# Altium footprint library Resistor.PcbLib: 88 footprints (part 5 of 6)
Each footprint in its own frame and in the unit in brackets; x right, y up, seen from the top. Pads: shape width x height; smd on the part's side, far side on the other; paste and mask are expansions set on the pad; w line width, h text height; cw(c..) or ccw(c..) is an arc to the next point about the centre after c.
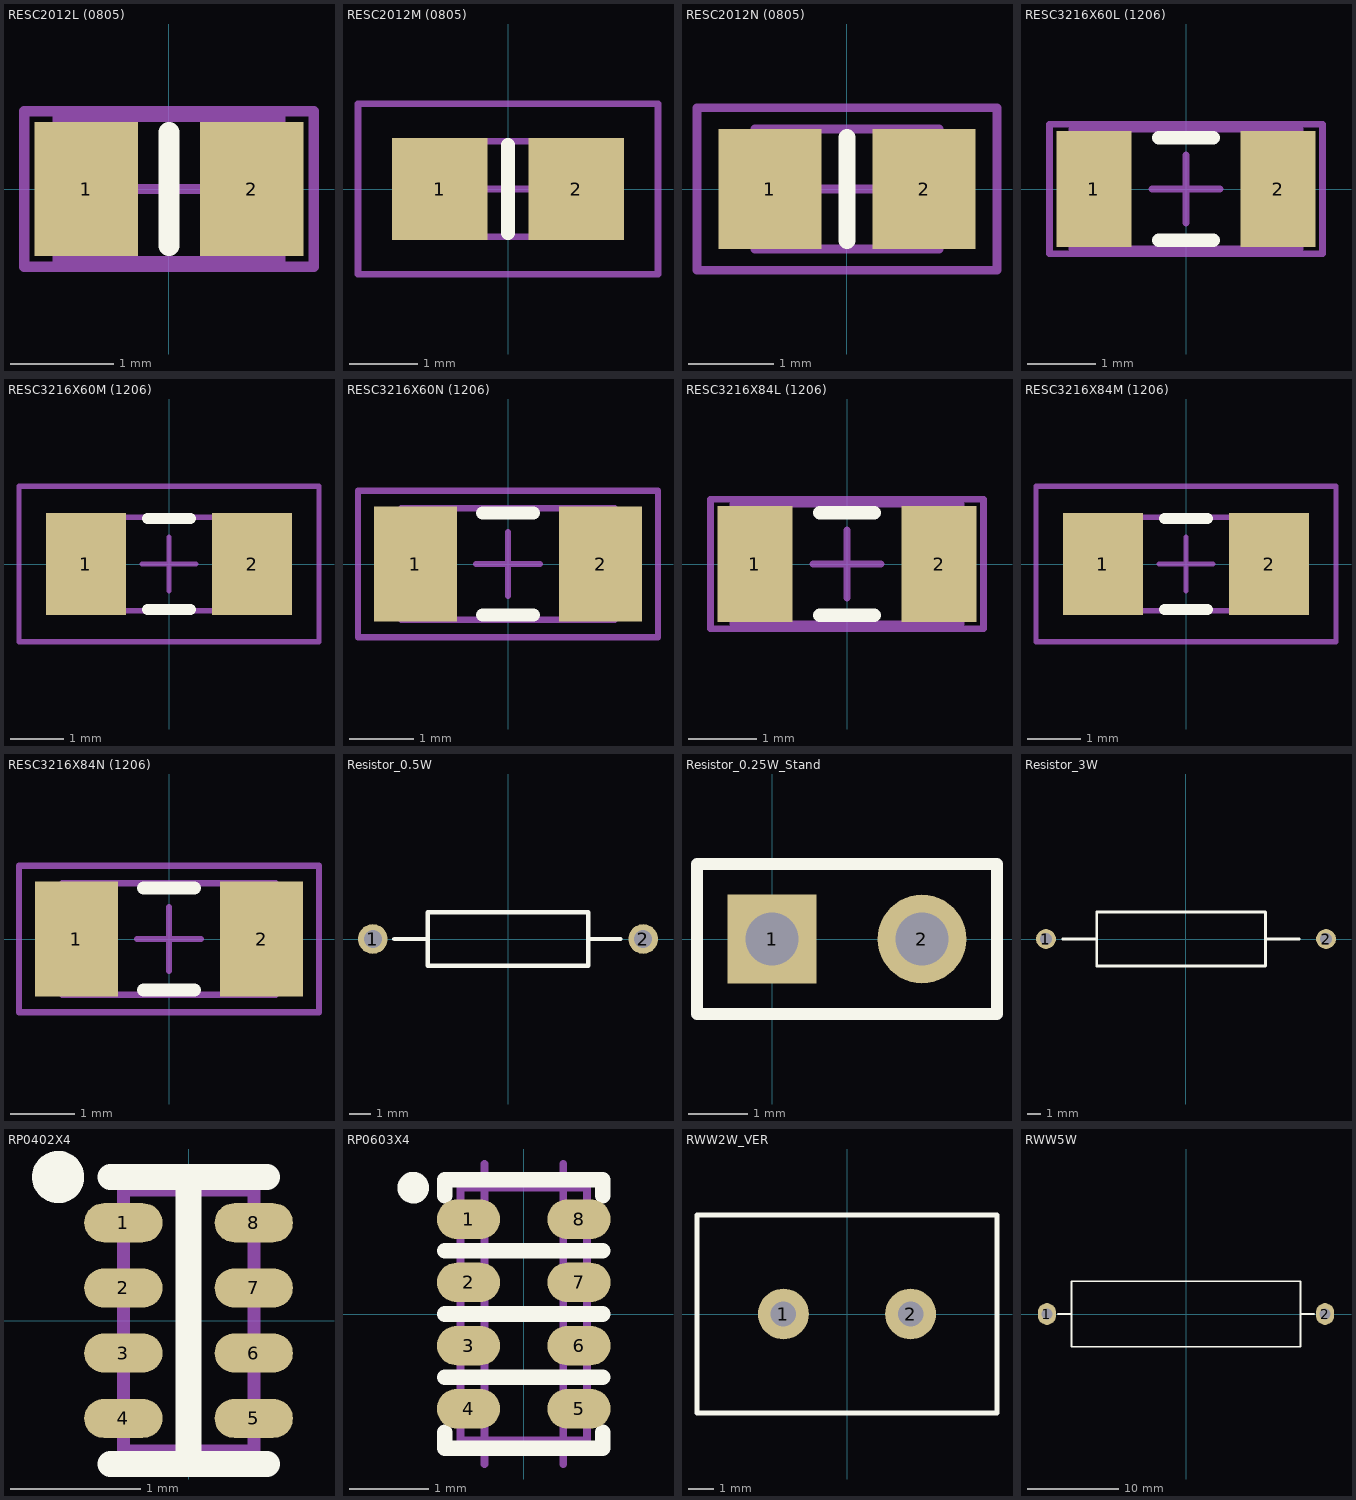
[diagram p4: the footprints below, top view; thin cyan lines are the x and y axes]

## RESC2012L (0805) [mm] "Chip Resistor, Body 2.0x1.3mm, IPC High Density"
height 0.65
pads (2):
  rect 1x1.3 smd: 1(-0.8,0) 2(0.8,0)
Top Overlay:
  lines w0.2: 0,-0.55 0,0.55
Mechanical 13:
  lines w0.1: -1.075,-0.7 -1.075,0.7 1.075,0.7 1.075,-0.7 -1.075,-0.7
Mechanical 15:
  lines w0.1: -0.5,0 0.5,0 ; 0,-0.5 0,0.5 ; -1.4,-0.75 -1.4,0.75 1.4,0.75 1.4,-0.75 -1.4,-0.75
3D body "0805.STEP": height 0.6, standoff 0, extent -1.016,-0.635 1.016,0.635

## RESC2012M (0805) [mm] "Chip Resistor, Body 2.0x1.3mm, IPC Low Density"
height 0.65
pads (2):
  rect 1.4x1.5 smd: 1(-1,0) 2(1,0)
Top Overlay:
  lines w0.2: 0,-0.65 0,0.65
Mechanical 13:
  lines w0.1: -1.075,-0.7 1.075,-0.7 1.075,0.7 -1.075,0.7 -1.075,-0.7
Mechanical 15:
  lines w0.1: -0.5,0 0.5,0 ; 0,-0.5 0,0.5 ; -2.2,-1.25 2.2,-1.25 2.2,1.25 -2.2,1.25 -2.2,-1.25
3D body "0805.STEP": height 0.6, standoff 0, extent -1.016,-0.635 1.016,0.635

## RESC2012N (0805) [mm] "Chip Resistor, Body 2.0x1.3mm, IPC Medium Density"
height 0.65
pads (2):
  rect 1.2x1.4 smd: 1(-0.9,0) 2(0.9,0)
Top Overlay:
  lines w0.2: 0,-0.6 0,0.6
Mechanical 13:
  lines w0.1: -1.075,-0.7 1.075,-0.7 1.075,0.7 -1.075,0.7 -1.075,-0.7
Mechanical 15:
  lines w0.1: -0.5,0 0.5,0 ; 0,-0.5 0,0.5 ; -1.75,-0.95 1.75,-0.95 1.75,0.95 -1.75,0.95 -1.75,-0.95
3D body "0805.STEP": height 0.6, standoff 0, extent -1.016,-0.635 1.016,0.635

## RESC3216X60L (1206) [mm] "Chip Resistor, Body 3.2x1.6x0.60 mm, IPC High Density"
height 0.61
pads (2):
  rect 1.1x1.7 smd: 1(-1.35,0) 2(1.35,0)
Top Overlay:
  lines w0.2: -0.4,-0.75 0.4,-0.75 ; -0.4,0.75 0.4,0.75
Mechanical 13:
  lines w0.1: -1.675,-0.875 1.675,-0.875 1.675,0.875 -1.675,0.875 -1.675,-0.875
Mechanical 15:
  lines w0.1: -0.5,0 0.5,0 ; 0,-0.5 0,0.5 ; -2,-0.95 2,-0.95 2,0.95 -2,0.95 -2,-0.95
3D body: height 0.6, standoff 0.6, extent -1.143,-0.737 1.143,0.737
3D body "RESC3216X60N.STEP": height 0.6, standoff 0, extent -1.6,-0.8 1.6,0.8

## RESC3216X60M (1206) [mm] "Chip Resistor, Body 3.2x1.6x0.60mm, IPC Low Density"
height 0.61
pads (2):
  rect 1.5x1.9 smd: 1(-1.55,0) 2(1.55,0)
Top Overlay:
  lines w0.2: -0.4,-0.85 0.4,-0.85 ; -0.4,0.85 0.4,0.85
Mechanical 13:
  lines w0.1: -1.675,-0.875 1.675,-0.875 1.675,0.875 -1.675,0.875 -1.675,-0.875
Mechanical 15:
  lines w0.1: -0.5,0 0.5,0 ; 0,-0.5 0,0.5 ; -2.8,-1.45 2.8,-1.45 2.8,1.45 -2.8,1.45 -2.8,-1.45
3D body: height 0.6, standoff 0.6, extent -1.143,-0.737 1.143,0.737
3D body "RESC3216X60N.STEP": height 0.6, standoff 0, extent -1.6,-0.8 1.6,0.8

## RESC3216X60N (1206) [mm] "Chip Resistor, Body 3.2x1.6x0.60 mm, IPC Medium Density"
height 0.61
pads (2):
  rect 1.3x1.8 smd: 1(-1.45,0) 2(1.45,0)
Top Overlay:
  lines w0.2: -0.4,-0.8 0.4,-0.8 ; -0.4,0.8 0.4,0.8
Mechanical 13:
  lines w0.1: -1.675,-0.875 -1.675,0.875 1.675,0.875 1.675,-0.875 -1.675,-0.875
Mechanical 15:
  lines w0.1: -0.5,0 0.5,0 ; 0,-0.5 0,0.5 ; -2.35,-1.15 -2.35,1.15 2.35,1.15 2.35,-1.15 -2.35,-1.15
3D body: height 0.6, standoff 0.6, extent -1.143,-0.737 1.143,0.737
3D body "RESC3216X60N.STEP": height 0.6, standoff 0, extent -1.6,-0.8 1.6,0.8

## RESC3216X84L (1206) [mm] "Chip Resistor, Body 3.2x1.6x0.84 mm, IPC High Density"
height 0.85
pads (2):
  rect 1.1x1.7 smd: 1(-1.35,0) 2(1.35,0)
Top Overlay:
  lines w0.2: -0.4,-0.75 0.4,-0.75 ; -0.4,0.75 0.4,0.75
Mechanical 13:
  lines w0.1: -1.675,-0.875 -1.675,0.875 1.675,0.875 1.675,-0.875 -1.675,-0.875
Mechanical 15:
  lines w0.1: -0.5,0 0.5,0 ; 0,-0.5 0,0.5 ; -2,-0.95 -2,0.95 2,0.95 2,-0.95 -2,-0.95
3D body "RESC3216X84N.STEP": height 0.84, standoff 0, extent -1.6,-0.8 1.6,0.8

## RESC3216X84M (1206) [mm] "Chip Resistor, Body 3.2x1.6x0.84mm, IPC Low Density"
height 0.85
pads (2):
  rect 1.5x1.9 smd: 1(-1.55,0) 2(1.55,0)
Top Overlay:
  lines w0.2: -0.4,-0.85 0.4,-0.85 ; -0.4,0.85 0.4,0.85
Mechanical 13:
  lines w0.1: -1.675,-0.875 -1.675,0.875 1.675,0.875 1.675,-0.875 -1.675,-0.875
Mechanical 15:
  lines w0.1: -0.5,0 0.5,0 ; 0,-0.5 0,0.5 ; -2.8,-1.45 -2.8,1.45 2.8,1.45 2.8,-1.45 -2.8,-1.45
3D body: height 0.84, standoff 0.84, extent -1.143,-0.737 1.143,0.737
3D body "RESC3216X84N.STEP": height 0.84, standoff 0, extent -1.6,-0.8 1.6,0.8

## RESC3216X84N (1206) [mm] "Chip Resistor, Body 3.2x1.6x0.84 mm, IPC Medium Density"
height 0.85
pads (2):
  rect 1.3x1.8 smd: 1(-1.45,0) 2(1.45,0)
Top Overlay:
  lines w0.2: -0.4,-0.8 0.4,-0.8 ; -0.4,0.8 0.4,0.8
Mechanical 13:
  lines w0.1: -1.675,-0.875 -1.675,0.875 1.675,0.875 1.675,-0.875 -1.675,-0.875
Mechanical 15:
  lines w0.1: -0.5,0 0.5,0 ; 0,-0.5 0,0.5 ; -2.35,-1.15 -2.35,1.15 2.35,1.15 2.35,-1.15 -2.35,-1.15
3D body: height 0.84, standoff 0.84, extent -1.143,-0.737 1.143,0.737
3D body "RESC3216X84N.STEP": height 0.84, standoff 0, extent -1.6,-0.8 1.6,0.8

## Resistor_0.5W [mm]
pads (2):
  round 1.4 hole 0.85: 1(-6.4,0) 2(6.4,0)
Top Overlay:
  lines w0.2: -5.384,0 -3.8,0 ; 3.8,0 5.324,0 ; -3.8,-1.27 -3.8,1.27 3.8,1.27 3.8,-1.27 -3.8,-1.27
3D body "Resistor_0.5W.STEP": height 4.38, standoff -2.07, extent -6.75,-1.875 6.7,1.875

## Resistor_0.25W_Stand [mm]
pads (2):
  rect 1.5x1.5 hole 0.9: 1(0,0)
  round 1.5 hole 0.9: 2(2.54,0)
Top Overlay:
  lines w0.2: -1.27,-1.27 -1.27,1.27 3.81,1.27 3.81,-1.27 -1.27,-1.27
3D body "Resistor_0.25W_Stand.STEP": height 7.75, standoff -1, extent -0.922,-0.92 2.79,0.921

## Resistor_3W [mm]
pads (2):
  round 1.5 hole 0.9: 1(-10.53,0) 2(10.53,0)
Top Overlay:
  lines w0.2: -9.26,0 -6.72,0 ; 5.98,0 8.52,0 ; -6.72,-2.032 5.98,-2.032 5.98,2.032 -6.72,2.032 -6.72,-2.032
3D body "Resistor_3W.STEP": height 7.3, standoff -3, extent -11.13,-3.3 11.07,3.3

## RP0402X4 [mm] "RPACK, 0804, 0402X4, 100X50X4, 2.00x1.00mm"
height 0.4
pads (8):
  oval 0.6x0.3 smd mask+0.1: 1(-0.5,0.75) 2(-0.5,0.25) 3(-0.5,-0.25) 4(-0.5,-0.75) 5(0.5,-0.75) 6(0.5,-0.25) 7(0.5,0.25) 8(0.5,0.75)
Top Overlay:
  circle w0.2: c-1,1.1 r0.1
  lines w0.2: -0.6,-1.1 0.6,-1.1 ; -0.6,1.1 0.6,1.1 ; 0,-1.1 0,1.1
Mechanical 13:
  lines w0.1: -0.5,-1 -0.5,1 0.5,1 0.5,-1 -0.5,-1
3D body: height 0.4, standoff 0, extent -0.5,-1 0.5,1

## RP0603X4 [mm] "RPACK, 0603X4, 160X80X4 1206"
height 0.4
pads (8):
  oval 0.8x0.5 smd: 1(-0.7,1.2) 2(-0.7,0.4) 3(-0.7,-0.4) 4(-0.7,-1.2) 5(0.7,-1.2) 6(0.7,-0.4) 7(0.7,0.4) 8(0.7,1.2)
Top Overlay:
  circle w0.2: c-1.4,1.6 r0.1
  lines w0.2: -1,-1.5 -1,-1.7 1,-1.7 1,-1.5 ; -1,-0.8 1,-0.8 ; -1,0 1,0 ; -1,0.8 1,0.8 ; -1,1.5 -1,1.7 1,1.7 1,1.5
Mechanical 13:
  lines w0.1: -0.5,-1.9 -0.5,1.9 ; 0.5,-1.9 0.5,1.9 ; -0.8,-1.6 0.8,-1.6 0.8,1.6 -0.8,1.6 -0.8,-1.6
3D body "User Library-Array-1206-4Way-Var1.STEP": height 0.5, standoff 0, extent -0.8,-1.6 0.8,1.6

## RWW2W_VER [mm] "RESISTOR 2 WATT, Wirewound"
pads (2):
  round 2 hole 1: 1(-2.5,0) 2(2.5,0)
Top Overlay:
  lines w0.2: -5.9,-3.9 5.9,-3.9 5.9,3.9 -5.9,3.9 -5.9,-3.9
3D body "User Library-Cement Power Resistor SQM-02 2W 4R3.step": height 20.5, standoff -5, extent -5.75,-3.75 5.75,3.75

## RWW5W [mm] "RESISTOR 5 WATT, Wirewound"
height 4.064
pads (2):
  oval 2x2.4 hole 1.2: 1(-15.3,0) 2(15.3,0)
Top Overlay:
  lines w0.2: -14.1,0 -12.6,0 ; 12.6,0 14.1,0 ; -12.6,-3.6 12.6,-3.6 12.6,3.6 -12.6,3.6 -12.6,-3.6
3D body "RES 5W.STEP": height 8.35, standoff -2.85, extent -15.645,-3.5 15.635,3.5